# Altium footprint library IC_SMD_BGA.PCBLIB: 97 footprints (part 6 of 11)
Each footprint in its own frame and in the unit in brackets; x right, y up, seen from the top. Pads: shape width x height; smd on the part's side, far side on the other; paste and mask are expansions set on the pad; w line width, h text height; cw(c..) or ccw(c..) is an arc to the next point about the centre after c.
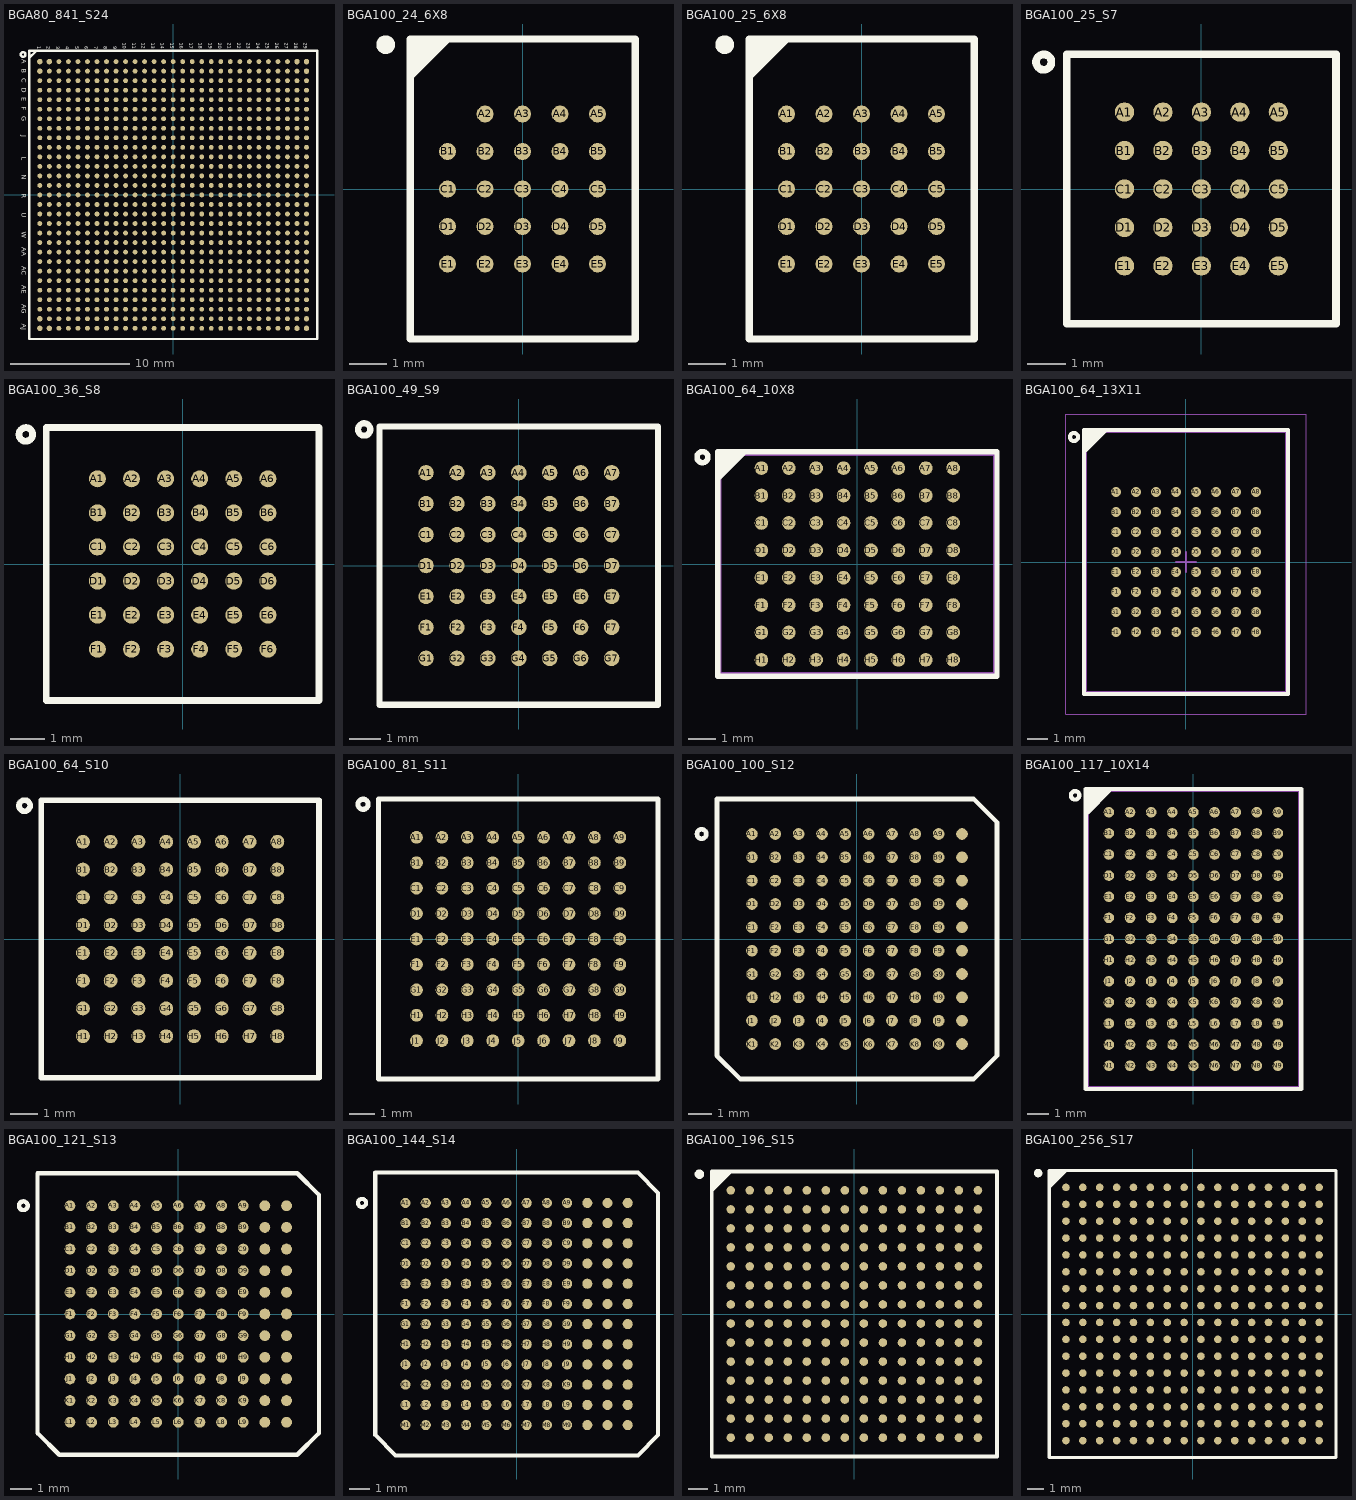
[diagram p5: the footprints below, top view; thin cyan lines are the x and y axes]

## BGA80_841_S24 [mil] "BGA_841P_31_945X945"
pads (841):
  round 18 smd: A1(-440.94,440.94) A2(-409.45,440.94) A28(409.45,440.94) A29(440.94,440.94) AH1(-440.94,-409.45) AH29(440.94,-409.45) AJ1(-440.94,-440.94) AJ2(-409.45,-440.94) AJ28(409.45,-440.94) AJ29(440.94,-440.94) B1(-440.94,409.45) B29(440.94,409.45)
  round 16 smd: A3(-377.95,440.94) A4(-346.46,440.94) A5(-314.96,440.94) A6(-283.46,440.94) A7(-251.97,440.94) A8(-220.47,440.94) A9(-188.98,440.94) A10(-157.48,440.94) A11(-125.98,440.94) A12(-94.49,440.94) A13(-62.99,440.94) A14(-31.5,440.94) A15(0,440.94) A16(31.5,440.94) A17(62.99,440.94) A18(94.49,440.94) A19(125.98,440.94) A20(157.48,440.94) A21(188.98,440.94) A22(220.47,440.94) A23(251.97,440.94) A24(283.46,440.94) A25(314.96,440.94) A26(346.46,440.94) A27(377.95,440.94) AA1(-440.94,-188.98) AA2(-409.45,-188.98) AA3(-377.95,-188.98) AA4(-346.46,-188.98) AA5(-314.96,-188.98) AA6(-283.46,-188.98) AA7(-251.97,-188.98) AA8(-220.47,-188.98) AA9(-188.98,-188.98) AA10(-157.48,-188.98) AA11(-125.98,-188.98) AA12(-94.49,-188.98) AA13(-62.99,-188.98) AA14(-31.5,-188.98) AA15(0,-188.98) AA16(31.5,-188.98) AA17(62.99,-188.98) AA18(94.49,-188.98) AA19(125.98,-188.98) AA20(157.48,-188.98) AA21(188.98,-188.98) AA22(220.47,-188.98) AA23(251.97,-188.98) AA24(283.46,-188.98) AA25(314.96,-188.98) AA26(346.46,-188.98) AA27(377.95,-188.98) AA28(409.45,-188.98) AA29(440.94,-188.98) AB1(-440.94,-220.47) AB2(-409.45,-220.47) AB3(-377.95,-220.47) AB4(-346.46,-220.47) AB5(-314.96,-220.47) AB6(-283.46,-220.47) AB7(-251.97,-220.47) AB8(-220.47,-220.47) AB9(-188.98,-220.47) AB10(-157.48,-220.47) AB11(-125.98,-220.47) AB12(-94.49,-220.47) AB13(-62.99,-220.47) AB14(-31.5,-220.47) AB15(0,-220.47) AB16(31.5,-220.47) AB17(62.99,-220.47) AB18(94.49,-220.47) AB19(125.98,-220.47) AB20(157.48,-220.47) AB21(188.98,-220.47) AB22(220.47,-220.47) AB23(251.97,-220.47) AB24(283.46,-220.47) AB25(314.96,-220.47) AB26(346.46,-220.47) AB27(377.95,-220.47) AB28(409.45,-220.47) AB29(440.94,-220.47) AC1(-440.94,-251.97) AC2(-409.45,-251.97) AC3(-377.95,-251.97) AC4(-346.46,-251.97) AC5(-314.96,-251.97) AC6(-283.46,-251.97) AC7(-251.97,-251.97) AC8(-220.47,-251.97) AC9(-188.98,-251.97) AC10(-157.48,-251.97) AC11(-125.98,-251.97) AC12(-94.49,-251.97) AC13(-62.99,-251.97) AC14(-31.5,-251.97) AC15(0,-251.97) AC16(31.5,-251.97) AC17(62.99,-251.97) AC18(94.49,-251.97) AC19(125.98,-251.97) AC20(157.48,-251.97) AC21(188.98,-251.97) AC22(220.47,-251.97) AC23(251.97,-251.97) AC24(283.46,-251.97) AC25(314.96,-251.97) AC26(346.46,-251.97) AC27(377.95,-251.97) AC28(409.45,-251.97) AC29(440.94,-251.97) AD1(-440.94,-283.46) AD2(-409.45,-283.46) AD3(-377.95,-283.46) AD4(-346.46,-283.46) AD5(-314.96,-283.46) AD6(-283.46,-283.46) AD7(-251.97,-283.46) AD8(-220.47,-283.46) AD9(-188.98,-283.46) AD10(-157.48,-283.46) AD11(-125.98,-283.46) AD12(-94.49,-283.46) AD13(-62.99,-283.46) AD14(-31.5,-283.46) AD15(0,-283.46) AD16(31.5,-283.46) AD17(62.99,-283.46) AD18(94.49,-283.46) AD19(125.98,-283.46) AD20(157.48,-283.46) AD21(188.98,-283.46) AD22(220.47,-283.46) AD23(251.97,-283.46) AD24(283.46,-283.46) AD25(314.96,-283.46) AD26(346.46,-283.46) AD27(377.95,-283.46) AD28(409.45,-283.46) AD29(440.94,-283.46) AE1(-440.94,-314.96) AE2(-409.45,-314.96) AE3(-377.95,-314.96) AE4(-346.46,-314.96) AE5(-314.96,-314.96) AE6(-283.46,-314.96) AE7(-251.97,-314.96) AE8(-220.47,-314.96) AE9(-188.98,-314.96) AE10(-157.48,-314.96) AE11(-125.98,-314.96) AE12(-94.49,-314.96) AE13(-62.99,-314.96) AE14(-31.5,-314.96) AE15(0,-314.96) AE16(31.5,-314.96) AE17(62.99,-314.96) AE18(94.49,-314.96) AE19(125.98,-314.96) AE20(157.48,-314.96) AE21(188.98,-314.96) AE22(220.47,-314.96) AE23(251.97,-314.96) AE24(283.46,-314.96) AE25(314.96,-314.96) AE26(346.46,-314.96) AE27(377.95,-314.96) AE28(409.45,-314.96) AE29(440.94,-314.96) AF1(-440.94,-346.46) AF2(-409.45,-346.46) AF3(-377.95,-346.46) AF4(-346.46,-346.46) AF5(-314.96,-346.46) AF6(-283.46,-346.46) AF7(-251.97,-346.46) AF8(-220.47,-346.46) AF9(-188.98,-346.46) AF10(-157.48,-346.46) AF11(-125.98,-346.46) AF12(-94.49,-346.46) AF13(-62.99,-346.46) AF14(-31.5,-346.46) AF15(0,-346.46) AF16(31.5,-346.46) AF17(62.99,-346.46) AF18(94.49,-346.46) AF19(125.98,-346.46) AF20(157.48,-346.46) AF21(188.98,-346.46) AF22(220.47,-346.46) AF23(251.97,-346.46) AF24(283.46,-346.46) AF25(314.96,-346.46) AF26(346.46,-346.46) AF27(377.95,-346.46) AF28(409.45,-346.46) AF29(440.94,-346.46) AG1(-440.94,-377.95) AG2(-409.45,-377.95) AG3(-377.95,-377.95) AG4(-346.46,-377.95) AG5(-314.96,-377.95) AG6(-283.46,-377.95) AG7(-251.97,-377.95) AG8(-220.47,-377.95) AG9(-188.98,-377.95) AG10(-157.48,-377.95) AG11(-125.98,-377.95) AG12(-94.49,-377.95) AG13(-62.99,-377.95) AG14(-31.5,-377.95) AG15(0,-377.95) AG16(31.5,-377.95) AG17(62.99,-377.95) AG18(94.49,-377.95) AG19(125.98,-377.95) AG20(157.48,-377.95) AG21(188.98,-377.95) AG22(220.47,-377.95) AG23(251.97,-377.95) AG24(283.46,-377.95) AG25(314.96,-377.95) AG26(346.46,-377.95) AG27(377.95,-377.95) AG28(409.45,-377.95) AG29(440.94,-377.95) AH2(-409.45,-409.45) AH3(-377.95,-409.45) AH4(-346.46,-409.45) AH5(-314.96,-409.45) AH6(-283.46,-409.45) AH7(-251.97,-409.45) AH8(-220.47,-409.45) AH9(-188.98,-409.45) AH10(-157.48,-409.45) AH11(-125.98,-409.45) AH12(-94.49,-409.45) AH13(-62.99,-409.45) AH14(-31.5,-409.45) AH15(0,-409.45) AH16(31.5,-409.45) AH17(62.99,-409.45) AH18(94.49,-409.45) AH19(125.98,-409.45) AH20(157.48,-409.45) AH21(188.98,-409.45) AH22(220.47,-409.45) AH23(251.97,-409.45) AH24(283.46,-409.45) AH25(314.96,-409.45) AH26(346.46,-409.45) AH27(377.95,-409.45) AH28(409.45,-409.45) AJ3(-377.95,-440.94) AJ4(-346.46,-440.94) AJ5(-314.96,-440.94) AJ6(-283.46,-440.94) AJ7(-251.97,-440.94) AJ8(-220.47,-440.94) AJ9(-188.98,-440.94) AJ10(-157.48,-440.94) AJ11(-125.98,-440.94) AJ12(-94.49,-440.94) AJ13(-62.99,-440.94) AJ14(-31.5,-440.94) AJ15(0,-440.94) AJ16(31.5,-440.94) AJ17(62.99,-440.94) AJ18(94.49,-440.94) AJ19(125.98,-440.94) AJ20(157.48,-440.94) AJ21(188.98,-440.94) AJ22(220.47,-440.94) AJ23(251.97,-440.94) AJ24(283.46,-440.94) AJ25(314.96,-440.94) AJ26(346.46,-440.94) AJ27(377.95,-440.94) B2(-409.45,409.45) B3(-377.95,409.45) B4(-346.46,409.45) B5(-314.96,409.45) B6(-283.46,409.45) B7(-251.97,409.45) B8(-220.47,409.45) B9(-188.98,409.45) B10(-157.48,409.45) B11(-125.98,409.45) B12(-94.49,409.45) B13(-62.99,409.45) B14(-31.5,409.45) B15(0,409.45) B16(31.5,409.45) B17(62.99,409.45) B18(94.49,409.45) B19(125.98,409.45) B20(157.48,409.45) B21(188.98,409.45) B22(220.47,409.45) B23(251.97,409.45) B24(283.46,409.45) B25(314.96,409.45) B26(346.46,409.45) B27(377.95,409.45) B28(409.45,409.45) C1(-440.94,377.95) C2(-409.45,377.95) C3(-377.95,377.95) C4(-346.46,377.95) C5(-314.96,377.95) C6(-283.46,377.95) C7(-251.97,377.95) C8(-220.47,377.95) C9(-188.98,377.95) C10(-157.48,377.95) C11(-125.98,377.95) C12(-94.49,377.95) C13(-62.99,377.95) C14(-31.5,377.95) C15(0,377.95) C16(31.5,377.95) C17(62.99,377.95) C18(94.49,377.95) C19(125.98,377.95) C20(157.48,377.95) C21(188.98,377.95) C22(220.47,377.95) C23(251.97,377.95) C24(283.46,377.95) C25(314.96,377.95) C26(346.46,377.95) C27(377.95,377.95) C28(409.45,377.95) C29(440.94,377.95) D1(-440.94,346.46) D2(-409.45,346.46) D3(-377.95,346.46) D4(-346.46,346.46) D5(-314.96,346.46) D6(-283.46,346.46) D7(-251.97,346.46) D8(-220.47,346.46) D9(-188.98,346.46) D10(-157.48,346.46) D11(-125.98,346.46) D12(-94.49,346.46) D13(-62.99,346.46) D14(-31.5,346.46) D15(0,346.46) D16(31.5,346.46) D17(62.99,346.46) D18(94.49,346.46) D19(125.98,346.46) D20(157.48,346.46) D21(188.98,346.46) D22(220.47,346.46) D23(251.97,346.46) D24(283.46,346.46) D25(314.96,346.46) D26(346.46,346.46) D27(377.95,346.46) D28(409.45,346.46) D29(440.94,346.46) E1(-440.94,314.96) E2(-409.45,314.96) E3(-377.95,314.96) E4(-346.46,314.96) E5(-314.96,314.96) E6(-283.46,314.96) E7(-251.97,314.96) E8(-220.47,314.96) E9(-188.98,314.96) E10(-157.48,314.96) E11(-125.98,314.96) E12(-94.49,314.96) E13(-62.99,314.96) E14(-31.5,314.96) E15(0,314.96) E16(31.5,314.96) E17(62.99,314.96) E18(94.49,314.96) E19(125.98,314.96) E20(157.48,314.96) E21(188.98,314.96) E22(220.47,314.96) E23(251.97,314.96) E24(283.46,314.96) E25(314.96,314.96) E26(346.46,314.96) E27(377.95,314.96) E28(409.45,314.96) E29(440.94,314.96) F1(-440.94,283.46) F2(-409.45,283.46) F3(-377.95,283.46) F4(-346.46,283.46) F5(-314.96,283.46) F6(-283.46,283.46) F7(-251.97,283.46) F8(-220.47,283.46) F9(-188.98,283.46) F10(-157.48,283.46) F11(-125.98,283.46) F12(-94.49,283.46) F13(-62.99,283.46) F14(-31.5,283.46) F15(0,283.46) F16(31.5,283.46) F17(62.99,283.46) F18(94.49,283.46) F19(125.98,283.46) F20(157.48,283.46) F21(188.98,283.46) F22(220.47,283.46) F23(251.97,283.46) F24(283.46,283.46) F25(314.96,283.46) F26(346.46,283.46) F27(377.95,283.46) F28(409.45,283.46) F29(440.94,283.46) G1(-440.94,251.97) G2(-409.45,251.97) G3(-377.95,251.97) G4(-346.46,251.97) G5(-314.96,251.97) G6(-283.46,251.97) G7(-251.97,251.97) G8(-220.47,251.97) G9(-188.98,251.97) G10(-157.48,251.97) G11(-125.98,251.97) G12(-94.49,251.97) G13(-62.99,251.97) G14(-31.5,251.97) G15(0,251.97) G16(31.5,251.97) G17(62.99,251.97) G18(94.49,251.97) G19(125.98,251.97) G20(157.48,251.97) G21(188.98,251.97) G22(220.47,251.97) G23(251.97,251.97) G24(283.46,251.97) G25(314.96,251.97) G26(346.46,251.97) G27(377.95,251.97) G28(409.45,251.97) G29(440.94,251.97) H1(-440.94,220.47) H2(-409.45,220.47) H3(-377.95,220.47) H4(-346.46,220.47) H5(-314.96,220.47) H6(-283.46,220.47) H7(-251.97,220.47) H8(-220.47,220.47) H9(-188.98,220.47) H10(-157.48,220.47) H11(-125.98,220.47) H12(-94.49,220.47) H13(-62.99,220.47) H14(-31.5,220.47) H15(0,220.47) H16(31.5,220.47) H17(62.99,220.47) H18(94.49,220.47) H19(125.98,220.47) H20(157.48,220.47) H21(188.98,220.47) H22(220.47,220.47) H23(251.97,220.47) H24(283.46,220.47) H25(314.96,220.47) H26(346.46,220.47) H27(377.95,220.47) H28(409.45,220.47) H29(440.94,220.47) J1(-440.94,188.98) J2(-409.45,188.98) J3(-377.95,188.98) J4(-346.46,188.98) J5(-314.96,188.98) J6(-283.46,188.98) J7(-251.97,188.98) J8(-220.47,188.98) J9(-188.98,188.98) J10(-157.48,188.98) J11(-125.98,188.98) J12(-94.49,188.98) J13(-62.99,188.98) J14(-31.5,188.98) J15(0,188.98) J16(31.5,188.98) J17(62.99,188.98) J18(94.49,188.98) J19(125.98,188.98) J20(157.48,188.98) J21(188.98,188.98) J22(220.47,188.98) J23(251.97,188.98) J24(283.46,188.98) J25(314.96,188.98) J26(346.46,188.98) J27(377.95,188.98) J28(409.45,188.98) J29(440.94,188.98) K1(-440.94,157.48) K2(-409.45,157.48) K3(-377.95,157.48) K4(-346.46,157.48) K5(-314.96,157.48) K6(-283.46,157.48) K7(-251.97,157.48) K8(-220.47,157.48) K9(-188.98,157.48) K10(-157.48,157.48) K11(-125.98,157.48) K12(-94.49,157.48) K13(-62.99,157.48) K14(-31.5,157.48) K15(0,157.48) K16(31.5,157.48) K17(62.99,157.48) K18(94.49,157.48) K19(125.98,157.48) K20(157.48,157.48) K21(188.98,157.48) K22(220.47,157.48) K23(251.97,157.48) K24(283.46,157.48) K25(314.96,157.48) K26(346.46,157.48) K27(377.95,157.48) K28(409.45,157.48) K29(440.94,157.48) L1(-440.94,125.98) L2(-409.45,125.98) L3(-377.95,125.98) L4(-346.46,125.98) L5(-314.96,125.98) L6(-283.46,125.98) L7(-251.97,125.98) L8(-220.47,125.98) L9(-188.98,125.98) L10(-157.48,125.98) L11(-125.98,125.98) L12(-94.49,125.98) L13(-62.99,125.98) L14(-31.5,125.98) L15(0,125.98) L16(31.5,125.98) L17(62.99,125.98) L18(94.49,125.98) L19(125.98,125.98) L20(157.48,125.98) L21(188.98,125.98) L22(220.47,125.98) L23(251.97,125.98) L24(283.46,125.98) L25(314.96,125.98) L26(346.46,125.98) L27(377.95,125.98) L28(409.45,125.98) L29(440.94,125.98) M1(-440.94,94.49) M2(-409.45,94.49) M3(-377.95,94.49) M4(-346.46,94.49) M5(-314.96,94.49) M6(-283.46,94.49) M7(-251.97,94.49) M8(-220.47,94.49) M9(-188.98,94.49) M10(-157.48,94.49) M11(-125.98,94.49) M12(-94.49,94.49) M13(-62.99,94.49) M14(-31.5,94.49) M15(0,94.49) M16(31.5,94.49) M17(62.99,94.49) M18(94.49,94.49) M19(125.98,94.49) M20(157.48,94.49) M21(188.98,94.49) M22(220.47,94.49) M23(251.97,94.49) M24(283.46,94.49) M25(314.96,94.49) M26(346.46,94.49) M27(377.95,94.49) M28(409.45,94.49) M29(440.94,94.49) N1(-440.94,62.99) N2(-409.45,62.99) N3(-377.95,62.99) N4(-346.46,62.99) N5(-314.96,62.99) N6(-283.46,62.99) N7(-251.97,62.99) N8(-220.47,62.99) N9(-188.98,62.99) N10(-157.48,62.99) N11(-125.98,62.99) N12(-94.49,62.99) N13(-62.99,62.99) N14(-31.5,62.99) N15(0,62.99) N16(31.5,62.99) N17(62.99,62.99) N18(94.49,62.99) N19(125.98,62.99) N20(157.48,62.99) N21(188.98,62.99) N22(220.47,62.99) N23(251.97,62.99) N24(283.46,62.99) N25(314.96,62.99) N26(346.46,62.99) N27(377.95,62.99) N28(409.45,62.99) N29(440.94,62.99) P1(-440.94,31.5) P2(-409.45,31.5) P3(-377.95,31.5) P4(-346.46,31.5) P5(-314.96,31.5) P6(-283.46,31.5) P7(-251.97,31.5) P8(-220.47,31.5) P9(-188.98,31.5) P10(-157.48,31.5) P11(-125.98,31.5) P12(-94.49,31.5) P13(-62.99,31.5) P14(-31.5,31.5) P15(0,31.5) P16(31.5,31.5) P17(62.99,31.5) P18(94.49,31.5) P19(125.98,31.5) P20(157.48,31.5) P21(188.98,31.5) P22(220.47,31.5) P23(251.97,31.5) P24(283.46,31.5) P25(314.96,31.5) P26(346.46,31.5) P27(377.95,31.5) P28(409.45,31.5) P29(440.94,31.5) R1(-440.94,0) R2(-409.45,0) R3(-377.95,0) R4(-346.46,0) R5(-314.96,0) R6(-283.46,0) R7(-251.97,0) R8(-220.47,0) R9(-188.98,0) R10(-157.48,0) R11(-125.98,0) R12(-94.49,0) R13(-62.99,0) R14(-31.5,0) R15(0,0) R16(31.5,0) R17(62.99,0) R18(94.49,0) R19(125.98,0) R20(157.48,0) R21(188.98,0) R22(220.47,0) R23(251.97,0) R24(283.46,0) R25(314.96,0) R26(346.46,0) R27(377.95,0) R28(409.45,0) R29(440.94,0) T1(-440.94,-31.5) T2(-409.45,-31.5) T3(-377.95,-31.5) T4(-346.46,-31.5) T5(-314.96,-31.5) T6(-283.46,-31.5) T7(-251.97,-31.5) T8(-220.47,-31.5) T9(-188.98,-31.5) T10(-157.48,-31.5) T11(-125.98,-31.5) T12(-94.49,-31.5) T13(-62.99,-31.5) T14(-31.5,-31.5) T15(0,-31.5) T16(31.5,-31.5) T17(62.99,-31.5) T18(94.49,-31.5) T19(125.98,-31.5) T20(157.48,-31.5) T21(188.98,-31.5) T22(220.47,-31.5) T23(251.97,-31.5) T24(283.46,-31.5) T25(314.96,-31.5) T26(346.46,-31.5) T27(377.95,-31.5) T28(409.45,-31.5) T29(440.94,-31.5) U1(-440.94,-62.99) U2(-409.45,-62.99) U3(-377.95,-62.99) U4(-346.46,-62.99) U5(-314.96,-62.99) U6(-283.46,-62.99) U7(-251.97,-62.99) U8(-220.47,-62.99) U9(-188.98,-62.99) U10(-157.48,-62.99) U11(-125.98,-62.99) U12(-94.49,-62.99) U13(-62.99,-62.99) U14(-31.5,-62.99) U15(0,-62.99) U16(31.5,-62.99) U17(62.99,-62.99) U18(94.49,-62.99) U19(125.98,-62.99) U20(157.48,-62.99) U21(188.98,-62.99) U22(220.47,-62.99) U23(251.97,-62.99) U24(283.46,-62.99) U25(314.96,-62.99) U26(346.46,-62.99) U27(377.95,-62.99) U28(409.45,-62.99) U29(440.94,-62.99) V1(-440.94,-94.49) V2(-409.45,-94.49) V3(-377.95,-94.49) V4(-346.46,-94.49) V5(-314.96,-94.49) V6(-283.46,-94.49) V7(-251.97,-94.49) V8(-220.47,-94.49) V9(-188.98,-94.49) V10(-157.48,-94.49) V11(-125.98,-94.49) V12(-94.49,-94.49) V13(-62.99,-94.49) V14(-31.5,-94.49) V15(0,-94.49) V16(31.5,-94.49) V17(62.99,-94.49) V18(94.49,-94.49) V19(125.98,-94.49) V20(157.48,-94.49) V21(188.98,-94.49) V22(220.47,-94.49) V23(251.97,-94.49) V24(283.46,-94.49) V25(314.96,-94.49) V26(346.46,-94.49) V27(377.95,-94.49) V28(409.45,-94.49) V29(440.94,-94.49) W1(-440.94,-125.98) W2(-409.45,-125.98) W3(-377.95,-125.98) W4(-346.46,-125.98) W5(-314.96,-125.98) W6(-283.46,-125.98) W7(-251.97,-125.98) W8(-220.47,-125.98) W9(-188.98,-125.98) W10(-157.48,-125.98) W11(-125.98,-125.98) W12(-94.49,-125.98) W13(-62.99,-125.98) W14(-31.5,-125.98) W15(0,-125.98) W16(31.5,-125.98) W17(62.99,-125.98) W18(94.49,-125.98) W19(125.98,-125.98) W20(157.48,-125.98) W21(188.98,-125.98) W22(220.47,-125.98) W23(251.97,-125.98) W24(283.46,-125.98) W25(314.96,-125.98) W26(346.46,-125.98) W27(377.95,-125.98) W28(409.45,-125.98) W29(440.94,-125.98) Y1(-440.94,-157.48) Y2(-409.45,-157.48) Y3(-377.95,-157.48) Y4(-346.46,-157.48) Y5(-314.96,-157.48) Y6(-283.46,-157.48) Y7(-251.97,-157.48) Y8(-220.47,-157.48) Y9(-188.98,-157.48) Y10(-157.48,-157.48) Y11(-125.98,-157.48) Y12(-94.49,-157.48) Y13(-62.99,-157.48) Y14(-31.5,-157.48) Y15(0,-157.48) Y16(31.5,-157.48) Y17(62.99,-157.48) Y18(94.49,-157.48) Y19(125.98,-157.48) Y20(157.48,-157.48) Y21(188.98,-157.48) Y22(220.47,-157.48) Y23(251.97,-157.48) Y24(283.46,-157.48) Y25(314.96,-157.48) Y26(346.46,-157.48) Y27(377.95,-157.48) Y28(409.45,-157.48) Y29(440.94,-157.48)
TopOverlay:
  circle w7.87: c-496.06,464.57 r7.87
  lines w7.87: -476.38,452.76 -452.76,476.38 ; -476.38,-476.38 476.38,-476.38 476.38,476.38 -476.38,476.38 -476.38,-476.38
  text "29" at 431.85,503.94 h11.81
  text "28" at 400.35,503.94 h11.81
  text "27" at 368.86,503.94 h11.81
  text "26" at 337.36,503.94 h11.81
  text "25" at 305.87,503.94 h11.81
  text "24" at 274.37,503.94 h11.81
  text "23" at 242.87,503.94 h11.81
  text "22" at 211.38,503.94 h11.81
  text "21" at 179.88,503.94 h11.81
  text "20" at 148.39,503.94 h11.81
  text "19" at 116.89,503.94 h11.81
  text "18" at 85.39,503.94 h11.81
  text "17" at 53.9,503.94 h11.81
  text "16" at 22.4,503.94 h11.81
  text "15" at -9.09,503.94 h11.81
  text "14" at -40.59,503.94 h11.81
  text "13" at -72.09,503.94 h11.81
  text "12" at -103.58,503.94 h11.81
  text "11" at -135.08,503.94 h11.81
  text "10" at -166.57,503.94 h11.81
  text "9" at -197.46,492.13 h11.81
  text "8" at -228.96,492.13 h11.81
  text "7" at -260.45,492.13 h11.81
  text "6" at -291.95,492.13 h11.81
  text "5" at -323.44,492.13 h11.81
  text "4" at -354.94,492.13 h11.81
  text "3" at -386.44,492.13 h11.81
  text "2" at -417.93,492.13 h11.81
  text "AJ" at -500,-425.19 h15.75
  text "AG" at -500,-362.2 h15.75